# Altium footprint library My_PCB_6_28.PcbLib: 151 footprints (part 9 of 10)
Each footprint in its own frame and in the unit in brackets; x right, y up, seen from the top. Pads: shape width x height; smd on the part's side, far side on the other; paste and mask are expansions set on the pad; w line width, h text height; cw(c..) or ccw(c..) is an arc to the next point about the centre after c.
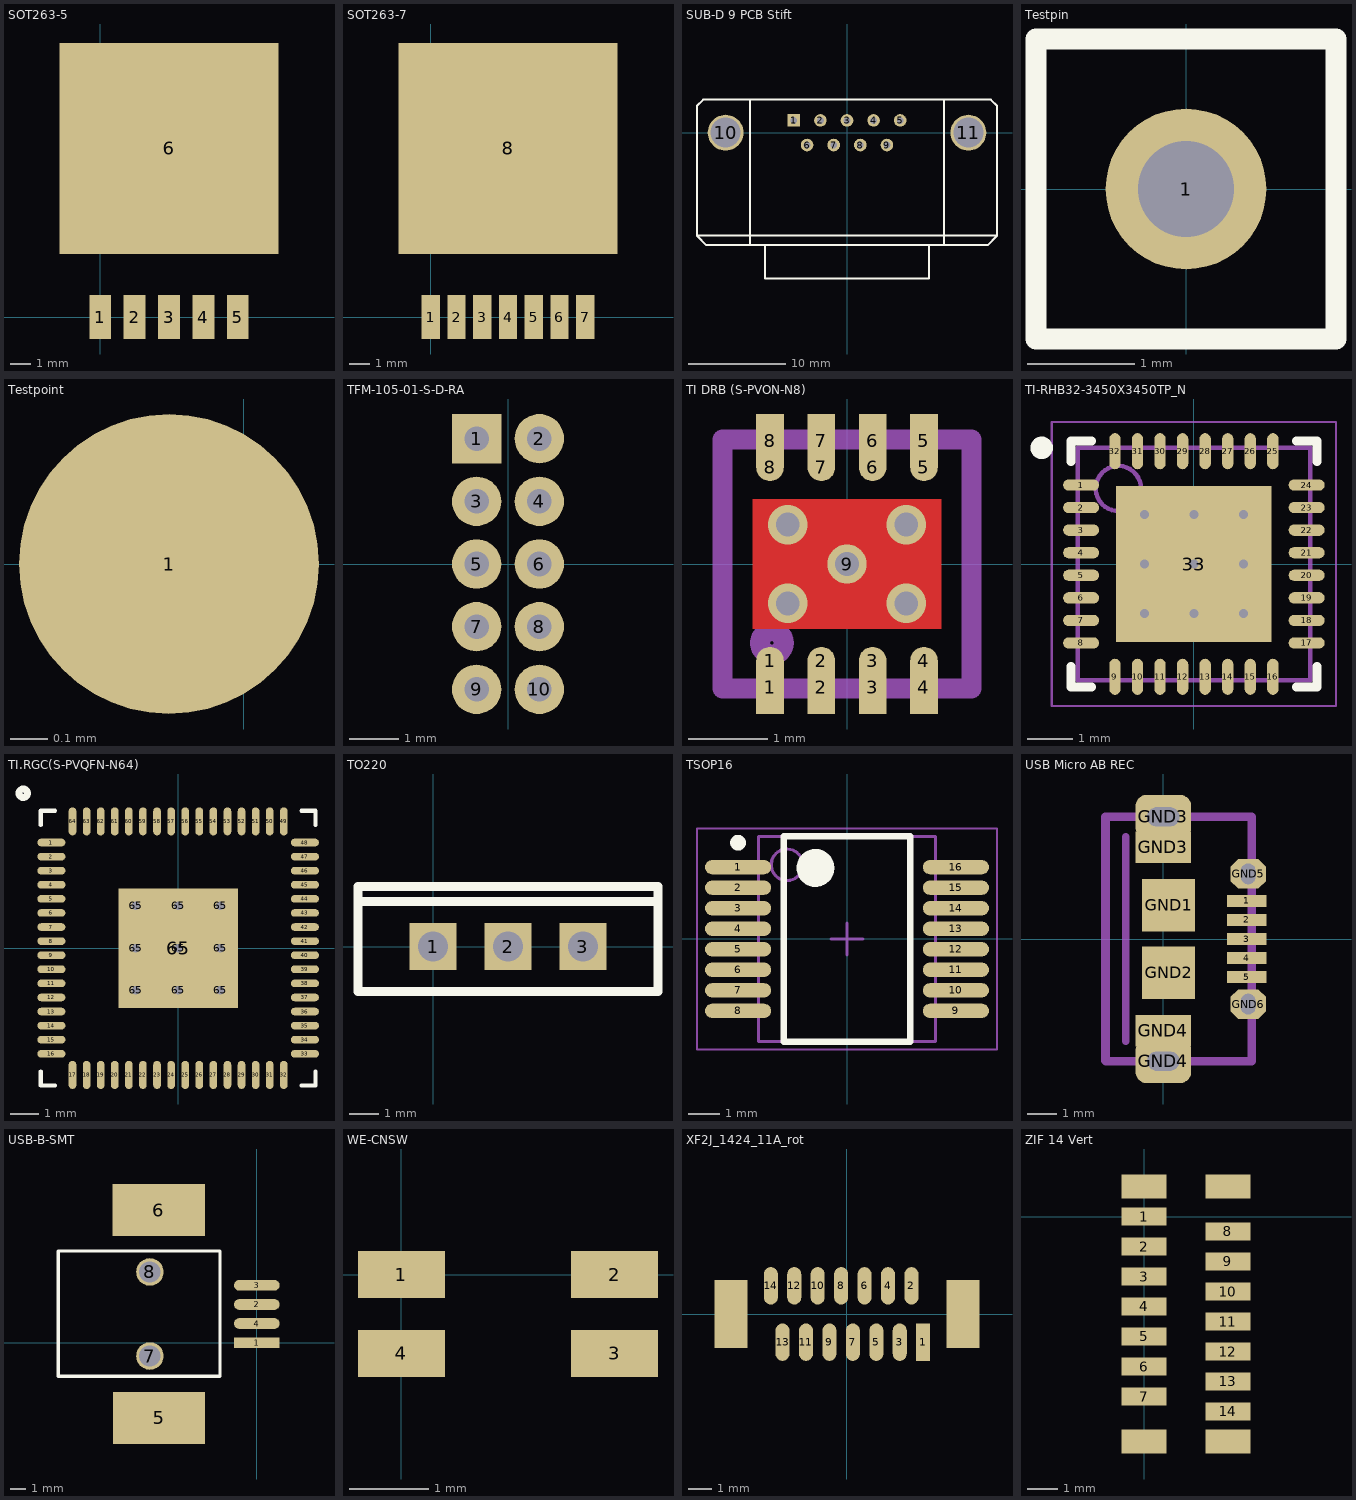
[diagram p8: the footprints below, top view; thin cyan lines are the x and y axes]

## SOT263-5 [mm]
pads (6):
  rect 1.07x2.16 smd: 1(0,0) 2(1.7,0) 3(3.4,0) 4(5.1,0) 5(6.8,0)
  rect 10.8x10.41 smd: 6(3.4,8.33)

## SOT263-7 [mm]
pads (8):
  rect 0.91x2.16 smd: 1(0,0) 2(1.27,0) 3(2.54,0) 4(3.81,0) 5(5.08,0) 6(6.35,0) 7(7.62,0)
  rect 10.8x10.41 smd: 8(3.81,8.32)

## SUB-D 9 PCB Stift [mm]
pads (11):
  rect 1.3x1.3 hole 0.7: 1(-5.48,1.27)
  round 1.3 hole 0.7: 2(-2.74,1.27) 3(0,1.27) 4(2.74,1.27) 5(5.48,1.27) 6(-4.11,-1.27) 7(-1.37,-1.27) 8(1.37,-1.27) 9(4.11,-1.27)
  round 3.7 hole 3.1: 10(-12.5,0) 11(12.5,0)
Top Overlay:
  lines w0.2: -15.45,-10.57 15.45,-10.57 ; -10,-11.57 -10,3.4 ; -8.45,-11.57 -8.45,-15 8.45,-15 8.45,-11.57 ; 10,-11.57 10,3.4 ; -15.45,-10.63 -15.45,2.77 -14.82,3.4 14.82,3.4 15.45,2.77 15.45,-10.61 14.49,-11.57 -14.51,-11.57 -15.45,-10.63
3D body: height 13.7, standoff -3.1, extent -15.54,-17.61 15.55,3.49

## Testpin [mm]
height 10
pads (1):
  round 1.5 hole 0.9: 1(0,0)
Top Overlay:
  lines w0.2: -1.4,-1.4 -1.4,1.4 1.4,1.4 1.4,-1.4 -1.4,-1.4

## Testpoint [mm]
pads (1):
  round 0.8 smd: 1(-0.2,0)

## TFM-105-01-S-D-RA [mm]
pads (10):
  rect 1x1 hole 0.5: 1(-0.635,2.54)
  round 1 hole 0.5: 2(0.635,2.54) 3(-0.635,1.27) 4(0.635,1.27) 5(-0.635,0) 6(0.635,0) 7(-0.635,-1.27) 8(0.635,-1.27) 9(-0.635,-2.54) 10(0.635,-2.54)

## TI DRB (S-PVON-N8) [mm] "TI DRB; 8 Pin; OPA2333"
height 1
pads (17):
  rect 0.35x0.675 smd paste-0.025 mask+0.07: 1(-0.975,-1.562) 2(-0.325,-1.562) 3(0.325,-1.562) 4(0.975,-1.562) 5(0.975,1.562) 6(0.325,1.562) 7(-0.325,1.562) 8(-0.975,1.562)
  round 0.35 smd paste-0.025 mask+0.07: 1(-0.975,-1.225) 2(-0.325,-1.225) 3(0.325,-1.225) 4(0.975,-1.225) 5(0.975,1.225) 6(0.325,1.225) 7(-0.325,1.225) 8(-0.975,1.225)
  round 0.5 hole 0.3: 9(0,0)
via -0.75,0.5 diameter 0.5 hole 0.3
via 0.75,0.5 diameter 0.5 hole 0.3
via 0.75,-0.5 diameter 0.5 hole 0.3
via -0.75,-0.5 diameter 0.5 hole 0.3
Top Layer:
  rectangle: -1.2,-0.825 1.2,0.825
Top Paste:
  rectangle: 0.125,-0.775 1.125,-0.125
  rectangle: 0.125,0.125 1.125,0.775
  rectangle: -1.125,-0.775 -0.125,-0.125
  rectangle: -1.125,0.125 -0.125,0.775
Top Solder:
  rectangle: -1.2,-0.825 1.2,0.825
Mechanical 1:
  circle w0.254: c-0.95,-1 r0.15
  lines w0.254: -1.575,-1.575 -1.575,1.575 1.575,1.575 1.575,-1.575 -1.575,-1.575
3D body: height 1.01, standoff 0, extent -1.099,-1.149 -0.801,-0.851
3D body: height 1, standoff 0, extent -1.574,-1.574 1.575,1.575

## TI-RHB32-3450X3450TP_N [mm] "QFN, 32-Leads, Body 5x5mm, Pitch 0.5mm, Thermal Pad 3.45x3.45mm, IPC Medium Density"
height 1
pads (33):
  oval 0.8x0.25 smd: 1(-2.5,1.75) 2(-2.5,1.25) 3(-2.5,0.75) 4(-2.5,0.25) 5(-2.5,-0.25) 6(-2.5,-0.75) 7(-2.5,-1.25) 8(-2.5,-1.75) 17(2.5,-1.75) 18(2.5,-1.25) 19(2.5,-0.75) 20(2.5,-0.25) 21(2.5,0.25) 22(2.5,0.75) 23(2.5,1.25) 24(2.5,1.75)
  oval 0.25x0.8 smd: 9(-1.75,-2.5) 10(-1.25,-2.5) 11(-0.75,-2.5) 12(-0.25,-2.5) 13(0.25,-2.5) 14(0.75,-2.5) 15(1.25,-2.5) 16(1.75,-2.5) 25(1.75,2.5) 26(1.25,2.5) 27(0.75,2.5) 28(0.25,2.5) 29(-0.25,2.5) 30(-0.75,2.5) 31(-1.25,2.5) 32(-1.75,2.5)
  rect 3.45x3.45 smd: 33(0,0)
via -1.1,1.1 diameter 0.5 hole 0.2
via 0,1.1 diameter 0.5 hole 0.2
via 1.1,1.1 diameter 0.5 hole 0.2
via -1.1,0 diameter 0.5 hole 0.2
via 0,0 diameter 0.5 hole 0.2
via 1.1,0 diameter 0.5 hole 0.2
via -1.1,-1.1 diameter 0.5 hole 0.2
via 0,-1.1 diameter 0.5 hole 0.2
via 1.1,-1.1 diameter 0.5 hole 0.2
Top Overlay:
  circle w0.25: c-3.375,2.575 r0.125
  lines w0.2: -2.725,-2.275 -2.725,-2.725 -2.275,-2.725 ; -2.725,2.275 -2.725,2.725 -2.275,2.725 ; 2.275,-2.725 2.725,-2.725 2.725,-2.275 ; 2.275,2.725 2.725,2.725 2.725,2.275
Mechanical 13:
  circle w0.1: c-1.675,1.675 r0.5
  lines w0.1: -2.575,-2.575 -2.575,2.575 2.575,2.575 2.575,-2.575 -2.575,-2.575
Mechanical 15:
  lines w0.05: -3.15,-3.15 -3.15,3.15 3.15,3.15 3.15,-3.15 -3.15,-3.15
  lines w0.1: -0.5,0 0.5,0 ; 0,-0.5 0,0.5
3D body: height 1, standoff 0, extent -2.575,-2.575 2.575,2.575

## TI.RGC(S-PVQFN-N64) [mm]
pads (74):
  oval 1x0.27 smd: 1(-4.5,3.75) 2(-4.5,3.25) 3(-4.5,2.75) 4(-4.5,2.25) 5(-4.5,1.75) 6(-4.5,1.25) 7(-4.5,0.75) 8(-4.5,0.25) 9(-4.5,-0.25) 10(-4.5,-0.75) 11(-4.5,-1.25) 12(-4.5,-1.75) 13(-4.5,-2.25) 14(-4.5,-2.75) 15(-4.5,-3.25) 16(-4.5,-3.75) 33(4.5,-3.75) 34(4.5,-3.25) 35(4.5,-2.75) 36(4.5,-2.25) 37(4.5,-1.75) 38(4.5,-1.25) 39(4.5,-0.75) 40(4.5,-0.25) 41(4.5,0.25) 42(4.5,0.75) 43(4.5,1.25) 44(4.5,1.75) 45(4.5,2.25) 46(4.5,2.75) 47(4.5,3.25) 48(4.5,3.75)
  oval 0.27x1 smd: 17(-3.75,-4.5) 18(-3.25,-4.5) 19(-2.75,-4.5) 20(-2.25,-4.5) 21(-1.75,-4.5) 22(-1.25,-4.5) 23(-0.75,-4.5) 24(-0.25,-4.5) 25(0.25,-4.5) 26(0.75,-4.5) 27(1.25,-4.5) 28(1.75,-4.5) 29(2.25,-4.5) 30(2.75,-4.5) 31(3.25,-4.5) 32(3.75,-4.5) 49(3.75,4.5) 50(3.25,4.5) 51(2.75,4.5) 52(2.25,4.5) 53(1.75,4.5) 54(1.25,4.5) 55(0.75,4.5) 56(0.25,4.5) 57(-0.25,4.5) 58(-0.75,4.5) 59(-1.25,4.5) 60(-1.75,4.5) 61(-2.25,4.5) 62(-2.75,4.5) 63(-3.25,4.5) 64(-3.75,4.5)
  round 0.6 hole 0.3: 65(-1.5,-1.5) 65(-1.5,0) 65(-1.5,1.5) 65(0,-1.5) 65(0,0) 65(0,1.5) 65(1.5,-1.5) 65(1.5,0) 65(1.5,1.5)
  rect 4.25x4.25 smd paste-25 mask+0: 65(0,0)
Top Overlay:
  circle w0.25: c-5.5,5.5 r0.15
  lines w0.15: -4.875,-4.375 -4.875,-4.875 -4.375,-4.875 ; -4.875,4.375 -4.875,4.875 -4.375,4.875 ; 4.375,-4.875 4.825,-4.875 ; 4.375,4.875 4.875,4.875 4.875,4.375 ; 4.875,-4.875 4.875,-4.375
3D body: height 0.87, standoff 0, extent -4.5,-4.5 4.5,4.5

## TO220 [mm]
height 25
pads (3):
  rect 1.6x1.6 hole 1: 1(0,0) 2(2.54,0) 3(5.08,0)
Top Overlay:
  lines w0.305: -2.54,1.524 7.62,1.524 ; -2.54,2 -2.54,-1.524 7.62,-1.524 7.62,2 ; -2.54,2.032 7.62,2.032

## TSOP16 [mm] "SOP, 16-Leads, Body 6.2x5.3mm, Pitch 0.65mm, IPC Medium Density"
pads (16):
  oval 2.1x0.45 smd: 1(-3.45,2.275) 2(-3.45,1.625) 3(-3.45,0.975) 4(-3.45,0.325) 5(-3.45,-0.325) 6(-3.45,-0.975) 7(-3.45,-1.625) 8(-3.45,-2.275) 9(3.45,-2.275) 10(3.45,-1.625) 11(3.45,-0.975) 12(3.45,-0.325) 13(3.45,0.325) 14(3.45,0.975) 15(3.45,1.625) 16(3.45,2.275)
Top Overlay:
  circle w0.25: c-3.45,3.05 r0.125
  circle w0.6: c-1,2.25 r0.3
  lines w0.2: -2,-3.25 -2,3.25 2,3.25 2,-3.25 -2,-3.25
Mechanical 13:
  circle w0.1: c-1.9,2.35 r0.5
  lines w0.1: -2.8,-3.25 -2.8,3.25 2.8,3.25 2.8,-3.25 -2.8,-3.25
Mechanical 15:
  lines w0.05: -4.75,-3.5 -4.75,3.5 4.75,3.5 4.75,-3.5 -4.75,-3.5
  lines w0.1: -0.5,0 0.5,0 ; 0,-0.5 0,0.5
3D body: height 0.05, standoff 0, extent -2.8,-3.25 2.8,3.25

## USB Micro AB REC [mm] "MOLEX-47589, MICRO USB AB, bottom mount"
pads (13):
  rect 1.35x0.4 smd: 1(2.855,1.3) 2(2.855,0.65) 3(2.855,0) 4(2.855,-0.65) 5(2.855,-1.3)
  rect 1.8x1.8 smd: GND1(0.18,1.15) GND2(0.18,-1.15)
  rect 1.9x1.075 smd: GND3(0,3.137) GND4(0,-3.137)
  rrect50% 1.9x1.5 hole 0.65 slot 1.1 at 0 deg: GND3(0,4.175) GND4(0,-4.175)
  oct 1.2x1 hole 0.5 slot 0.7 at 90 deg: GND5(2.9,2.225) GND6(2.9,-2.225)
Mechanical 13:
  lines w0.254: -1.98,-4.155 -1.96,-4.175 ; -1.28,-3.5 -1.28,3.5
  lines w0.3: -1.98,-4.155 -1.98,4.175 3.025,4.175 3.025,-4.175 -1.96,-4.175
3D body: height 2.76, standoff -0.58, extent -2.775,-4.3 3.019,4.35

## USB-B-SMT [mm]
pads (8):
  rect 3x0.7 smd: 1(0,0)
  oval 3x0.7 smd: 2(0,2.5) 3(0,3.75) 4(0,1.25)
  rect 6.04x3.4 smd: 5(-6.4,-4.925) 6(-6.42,8.675)
  round 1.8 hole 1.4: 7(-7,-0.875) 8(-7,4.625)
Top Overlay:
  lines w0.2: -2.47,-2.2 -13,-2.2 -13,6 -2.4,6 -2.4,-2.2
3D body: height 11.31, standoff -1.11, extent -16.06,-6.4 1.04,10.1

## WE-CNSW [mm]
pads (4):
  rect 1.1x0.6 smd: 1(0,0) 2(2.7,0) 3(2.7,-1) 4(0,-1)
3D body: height 1.95, standoff 0.05, extent -0.24,-1.3 2.96,0.3

## XF2J_1424_11A_rot [mm]
pads (16):
  rect 0.6x1.6 smd: 1(3.25,-1.2)
  oval 0.6x1.6 smd: 2(2.75,1.2) 3(2.25,-1.2) 4(1.75,1.2) 5(1.25,-1.2) 6(0.75,1.2) 7(0.25,-1.2) 8(-0.25,1.2) 9(-0.75,-1.2) 10(-1.25,1.2) 11(-1.75,-1.2) 12(-2.25,1.2) 13(-2.75,-1.2) 14(-3.25,1.2)
  rect 1.4x2.9 smd: ""(-4.95,0) ""(4.95,0)
3D body: height 4.15, standoff 0, extent -5.75,-1.8 5.75,1.65

## ZIF 14 Vert [mm]
pads (18):
  rect 1.5x0.6 smd: 1(0,0) 2(0,-1) 3(0,-2) 4(0,-3) 5(0,-4) 6(0,-5) 7(0,-6) 8(2.8,-0.5) 9(2.8,-1.5) 10(2.8,-2.5) 11(2.8,-3.5) 12(2.8,-4.5) 13(2.8,-5.5) 14(2.8,-6.5)
  rect 1.5x0.8 smd: ""(0,-7.5) ""(0,1) ""(2.8,-7.5) ""(2.8,1)